# Altium footprint library Gate Driver Board.PcbLib: 117 footprints (part 4 of 8)
Each footprint in its own frame and in the unit in brackets; x right, y up, seen from the top. Pads: shape width x height; smd on the part's side, far side on the other; paste and mask are expansions set on the pad; w line width, h text height; cw(c..) or ccw(c..) is an arc to the next point about the centre after c.
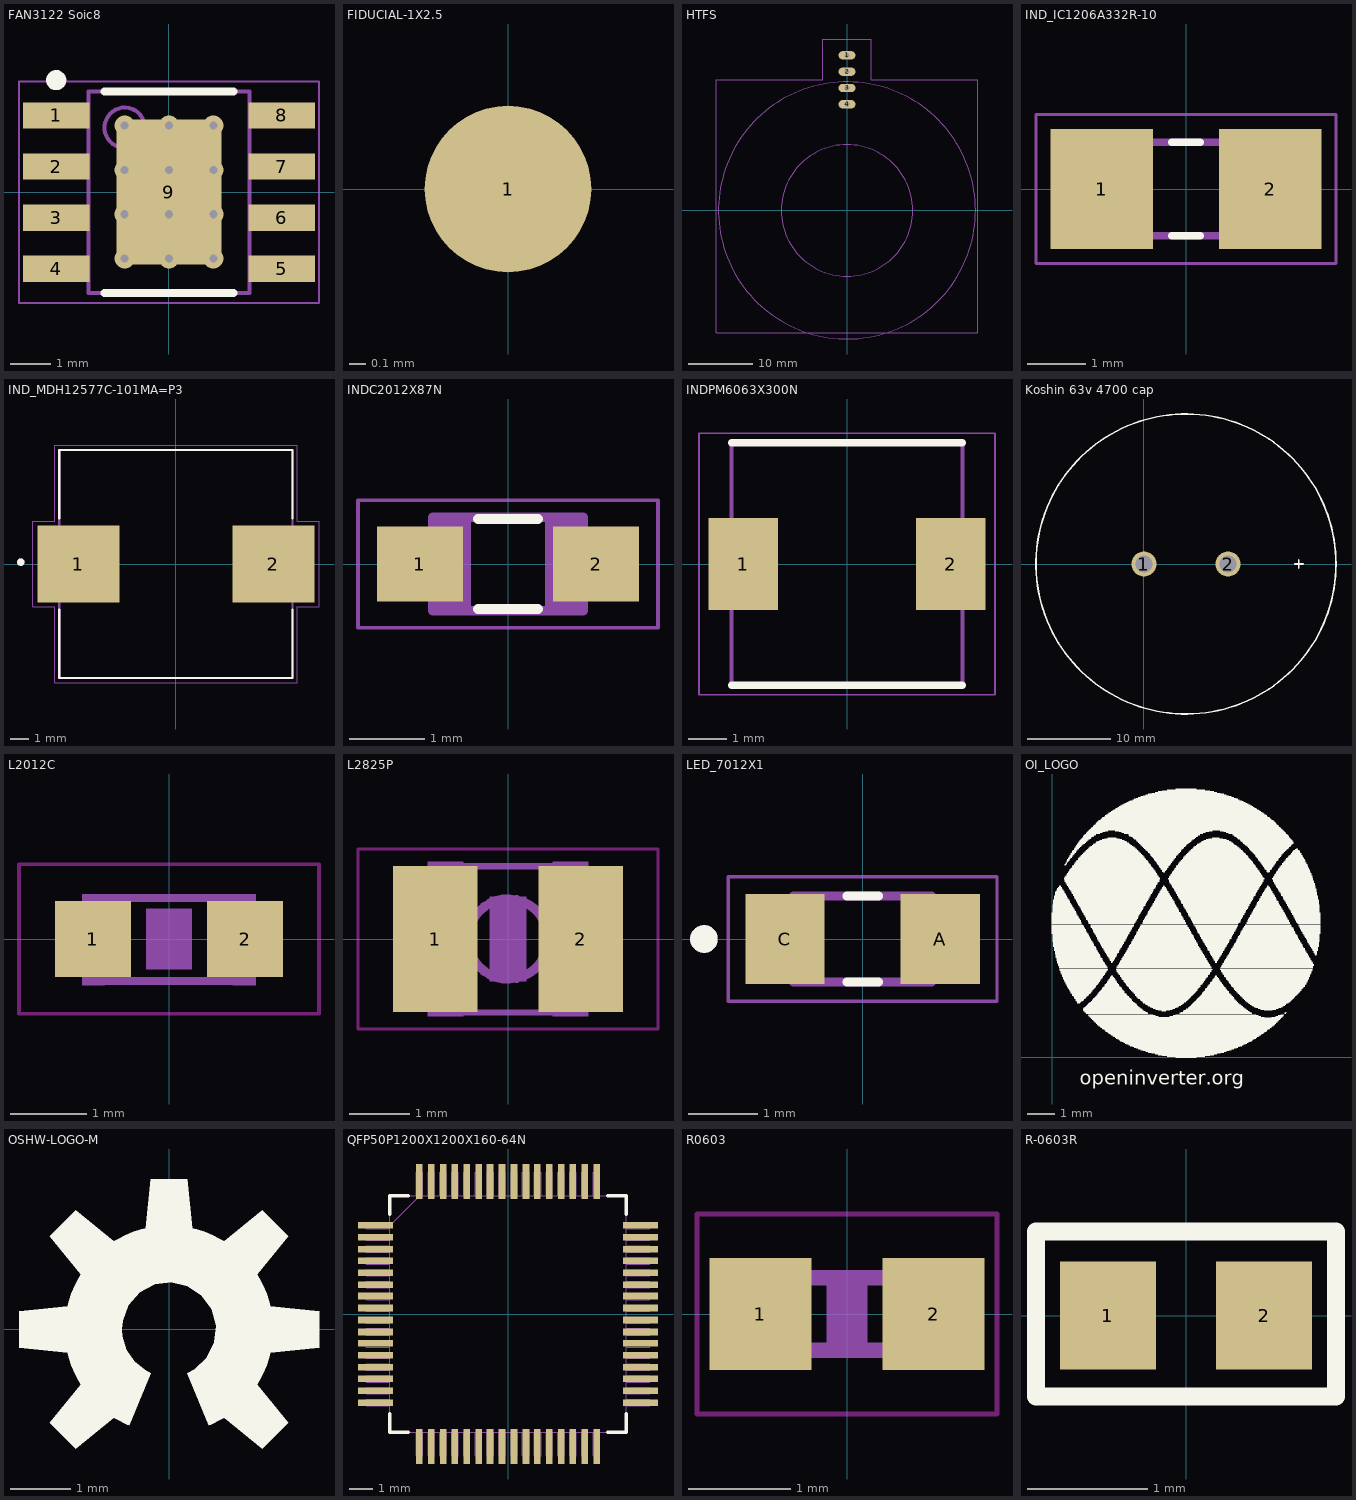
[diagram p3: the footprints below, top view; thin cyan lines are the x and y axes]

## FAN3122 Soic8 [mm] "SOIC, 8-Leads, Body 4.95x3.95mm, Pitch 1.27mm, Thermal Pad 4.10x3.10mm, IPC Medium Density"
height 1.75
pads (9):
  rect 1.65x0.65 smd: 1(-2.8,1.905) 2(-2.8,0.635) 3(-2.8,-0.635) 4(-2.8,-1.905) 5(2.8,-1.905) 6(2.8,-0.635) 7(2.8,0.635) 8(2.8,1.905)
  rect 2.6x3.6 smd: 9(0,0)
via -1.1,1.65 diameter 0.5 hole 0.2
via 0,1.65 diameter 0.5 hole 0.2
via 1.1,1.65 diameter 0.5 hole 0.2
via -1.1,0.55 diameter 0.5 hole 0.2
via 0,0.55 diameter 0.5 hole 0.2
via 1.1,0.55 diameter 0.5 hole 0.2
via -1.1,-0.55 diameter 0.5 hole 0.2
via 0,-0.55 diameter 0.5 hole 0.2
via 1.1,-0.55 diameter 0.5 hole 0.2
via -1.1,-1.65 diameter 0.5 hole 0.2
via 0,-1.65 diameter 0.5 hole 0.2
via 1.1,-1.65 diameter 0.5 hole 0.2
Top Overlay:
  circle w0.25: c-2.8,2.78 r0.125
  lines w0.2: -1.6,-2.5 1.6,-2.5 ; -1.6,2.5 1.6,2.5
Assembly Top:
  circle w0.1: c-1.1,1.6 r0.5
  lines w0.1: -2,-2.5 -2,2.5 2,2.5 2,-2.5 -2,-2.5
Courtyard Top:
  lines w0.05: -3.725,-2.75 -3.725,2.75 3.725,2.75 3.725,-2.75 -3.725,-2.75
  lines w0.1: -0.5,0 0.5,0 ; 0,-0.5 0,0.5
3D body "User Library-SOIC8_JEDEC_MS-012AA.STEP": height 1.66, standoff -0.09, extent -3.124,-2.55 3.075,2.45

## FIDUCIAL-1X2.5 [mm] "FIDUCIAL-1X2.5"
pads (1):
  rrect100% 1x1 smd paste+0: 1(0,0)
Top Solder:
  circle w1.27: c0,0 r0.9

## HTFS [mil] "HTFS"
pads (4):
  oval 103x51.5 / inner round 0 / far side oval 103x51.5 hole 31.5: 1(0,950) 2(0,850) 3(0,750) 4(0,650)
3D Body Bottom:
  circle w5: c0,0 r403.11
  circle w5: c0,0 r787.4
  lines w5: -800,-750 -800,800 -150,800 -150,1050 150,1050 150,800 800,800 800,-750 -800,-750
3D body: height 50, standoff 0, extent -51.72,624.03 51.72,675.97
3D body: height 50, standoff 0, extent -51.72,724.03 51.72,775.97
3D body: height 50, standoff 0, extent -51.72,824.03 51.72,875.97
3D body: height 50, standoff 0, extent -51.72,924.03 51.72,975.97

## IND_IC1206A332R-10 [mm]
pads (2):
  rect 1.76x2.06 smd: 1(-1.445,0) 2(1.445,0)
Top Overlay:
  lines w0.127: -0.245,-0.8 0.245,-0.8 ; -0.245,0.8 0.245,0.8
Mechanical 13:
  lines w0.127: -1.6,-0.8 -1.6,0.8 1.6,0.8 1.6,-0.8 -1.6,-0.8
Mechanical 15:
  lines w0.05: -2.575,-1.28 -2.575,1.28 2.575,1.28 2.575,-1.28 -2.575,-1.28
3D body "step_temp.STEP": height 1.4, standoff 0, extent -1.6,-0.8 1.6,0.8

## IND_MDH12577C-101MA=P3 [mm]
pads (2):
  rect 4.5x4.2 smd: 1(-5.35,0) 2(5.35,0)
Top Overlay:
  circle w0.2: c-8.505,0.1 r0.1
  lines w0.127: -6.4,-2.5 -6.4,-6.25 6.4,-6.25 6.4,-2.5 ; -6.4,2.5 -6.4,6.25 6.4,6.25 6.4,2.5
Mechanical 13:
  circle w0.2: c-8.505,0.1 r0.1
  lines w0.127: -6.4,-6.25 6.4,-6.25 6.4,6.25 -6.4,6.25 -6.4,-6.25
Mechanical 15:
  lines w0.05: -7.85,-2.35 -6.65,-2.35 -6.65,-6.5 6.65,-6.5 6.65,-2.35 7.85,-2.35 7.85,2.35 6.65,2.35 6.65,6.5 -6.65,6.5 -6.65,2.35 -7.85,2.35 -7.85,-2.35
3D body "MDH12577C-101MA=P3.STEP": height 8, standoff 0, extent -6.358,-6.278 6.442,6.222

## INDC2012X87N [mm]
pads (2):
  rect 1.15x1 smd: 1(-1.175,0) 2(1.175,0)
Top Overlay:
  lines w0.127: -0.4,-0.6 0.4,-0.6 ; -0.4,0.6 0.4,0.6
Mechanical 13:
  region: -0.5,-0.625 -1,-0.625 -1,0.625 -0.5,0.625
  region: 1,-0.625 0.5,-0.625 0.5,0.625 1,0.625
  lines w0.127: -1,-0.625 1,-0.625 1,0.625 -1,0.625 -1,-0.625
Mechanical 15:
  lines w0.051: -2,-0.85 2,-0.85 2,0.85 -2,0.85 -2,-0.85
3D body "MLZ2012M100HTD25.STEP": height 1.03, standoff -0.02, extent -1,-0.625 1,0.625

## INDPM6063X300N [mm]
pads (2):
  rect 1.8x2.4 smd: 1(-2.7,0) 2(2.7,0)
Top Overlay:
  lines w0.2: -3,-3.15 3,-3.15 ; -3,3.15 3,3.15
Mechanical 13:
  lines w0.1: -3,-3.15 -3,3.15 3,3.15 3,-3.15 -3,-3.15
Mechanical 15:
  lines w0.05: -3.85,-3.4 -3.85,3.4 3.85,3.4 3.85,-3.4 -3.85,-3.4
3D body "B82462G4333M000.stp": height 3, standoff 0, extent -3,-3.15 3,3.15

## Koshin 63v 4700 cap [mm]
pads (2):
  round 3 hole 2: 1(0,0) 2(10.1,0)
Top Overlay:
  circle w0.2: c5.05,0 r18
  lines w0.2: 18.082,0 19.098,0 ; 18.59,-0.508 18.59,0.508
3D body "Snap-Cap 35mm W x 50mm H 10mm pitch.step": height 50, standoff -6.2, extent -12.571,-17.421 22.425,17.575

## L2012C [mm] "L2012C"
pads (2):
  rect 1x1 smd: 1(-1,0) 2(1,0)
Top Layer keep-out:
  lines w0.051: -1.973,-0.983 1.973,-0.983 1.973,0.983 -1.973,0.983 -1.973,-0.983
Assembly Bottom:
  region: -1.143,-0.61 -1.143,0.59 -0.843,0.59 -0.843,-0.61
  region: 0.838,-0.61 0.838,0.59 1.138,0.59 1.138,-0.61
  lines w0.102: -0.864,-0.553 0.864,-0.553 ; -0.864,0.54 0.864,0.54
Top Glue Points:
  region: -0.3,-0.4 -0.3,0.4 0.3,0.4 0.3,-0.4

## L2825P [mm] "L2825P"
pads (2):
  rect 1.4x2.4 smd: 1(-1.2,0) 2(1.2,0)
Top Layer keep-out:
  lines w0.051: -2.473,-1.483 2.473,-1.483 2.473,1.483 -2.473,1.483 -2.473,-1.483
Assembly Bottom:
  circle w0.152: c0,0 r0.66
  region: 0.737,-1.27 0.737,1.27 1.321,1.27 1.321,-1.27
  region: -1.321,-1.27 -1.321,1.27 -0.737,1.27 -0.737,-1.27
  lines w0.102: -1.34,-0.965 -1.34,0.965 ; -0.762,-1.213 0.762,-1.213 ; -0.762,1.2 0.762,1.2 ; 1.34,-0.965 1.34,0.965
Top Glue Points:
  region: -0.3,-0.7 -0.3,0.7 0.3,0.7 0.3,-0.7

## LED_7012X1 [mm]
pads (2):
  rect 1.15x1.3 smd: A(1.125,0) C(-1.125,0)
Top Overlay:
  circle w0.2: c-2.3,0 r0.1
  lines w0.127: -0.23,-0.625 0.23,-0.625 ; -0.23,0.625 0.23,0.625
Mechanical 13:
  circle w0.2: c-2.3,0 r0.1
  lines w0.127: -1,-0.625 -1,0.625 1,0.625 1,-0.625 -1,-0.625
Mechanical 15:
  lines w0.05: -1.95,-0.9 -1.95,0.9 1.95,0.9 1.95,-0.9 -1.95,-0.9
3D body "7012X1--3DModel-STEP-1.STEP": height 0.73, standoff 0, extent -1.003,-0.622 1.003,0.622

## OI_LOGO [mm] "OI_LOGO"
Top Overlay:
  drawing of 1208 lines, arcs and shapes, not listed
  text "openinverter.org" at 1,-1 h0.52

## OSHW-LOGO-M [mm] "OSHW-LOGO-M"
Top Overlay:
  region: 0.658,-1.588 0.691,-1.574 0.755,-1.544 0.819,-1.512 0.881,-1.477 0.911,-1.458 1.539,-1.97 1.97,-1.539 1.458,-0.911 1.495,-0.85 1.561,-0.724 1.615,-0.592 1.659,-0.456 1.675,-0.387 2.481,-0.305 2.481,0.305 1.675,0.387 1.659,0.456 1.615,0.592 1.561,0.724 1.495,0.85 1.458,0.911 1.97,1.539 1.539,1.97 0.911,1.458 0.85,1.495 0.724,1.561 0.592,1.615 0.456,1.659 0.387,1.675 0.305,2.481 -0.305,2.481 -0.387,1.675 -0.456,1.659 -0.592,1.615 -0.724,1.561 -0.85,1.495 -0.911,1.458 -1.539,1.97 -1.97,1.539 -1.458,0.911 -1.495,0.85 -1.561,0.724 -1.615,0.592 -1.659,0.456 -1.675,0.387 -2.481,0.305 -2.481,-0.305 -1.675,-0.387 -1.659,-0.456 -1.615,-0.592 -1.561,-0.724 -1.495,-0.85 -1.458,-0.911 -1.97,-1.539 -1.539,-1.97 -0.911,-1.458 -0.881,-1.477 -0.819,-1.512 -0.755,-1.544 -0.691,-1.574 -0.658,-1.588 -0.299,-0.722 -0.402,-0.67 -0.579,-0.525 -0.706,-0.334 -0.773,-0.115 -0.781,0 -0.769,0.14 -0.67,0.402 -0.486,0.612 -0.239,0.744 0.038,0.78 0.311,0.717 0.543,0.561 0.706,0.334 0.779,0.064 0.751,-0.215 0.628,-0.465 0.423,-0.657 0.299,-0.722

## QFP50P1200X1200X160-64N [mil]
pads (64):
  rect 58x11 smd: 1(-221,148) 2(-221,128) 3(-221,108) 4(-221,89) 5(-221,69) 6(-221,49) 7(-221,30) 8(-221,10) 9(-221,-10) 10(-221,-30) 11(-221,-49) 12(-221,-69) 13(-221,-89) 14(-221,-108) 15(-221,-128) 16(-221,-148) 33(221,-148) 34(221,-128) 35(221,-108) 36(221,-89) 37(221,-69) 38(221,-49) 39(221,-30) 40(221,-10) 41(221,10) 42(221,30) 43(221,49) 44(221,69) 45(221,89) 46(221,108) 47(221,128) 48(221,148)
  rect 11x58 smd: 17(-148,-221) 18(-128,-221) 19(-108,-221) 20(-89,-221) 21(-69,-221) 22(-49,-221) 23(-30,-221) 24(-10,-221) 25(10,-221) 26(30,-221) 27(49,-221) 28(69,-221) 29(89,-221) 30(108,-221) 31(128,-221) 32(148,-221) 49(148,221) 50(128,221) 51(108,221) 52(89,221) 53(69,221) 54(49,221) 55(30,221) 56(10,221) 57(-10,221) 58(-30,221) 59(-49,221) 60(-69,221) 61(-89,221) 62(-108,221) 63(-128,221) 64(-148,221)
Top Overlay:
  lines w6: -197,-166 -197,-197 -166,-197 ; -197,166 -197,197 -166,197 ; 166,-197 197,-197 197,-166 ; 166,197 197,197 197,166
Mechanical 13:
  drawing of 331 lines, arcs and shapes, not listed
3D body "STM32F103RBT6--3DModel-STEP-56544.STEP": height 63.54, standoff 0.55, extent -236.21,-236.22 236.23,236.22

## R0603 [mm] "R0603"
pads (2):
  rect 1x1.1 smd: 1(-0.85,0) 2(0.85,0)
Top Layer keep-out:
  lines w0.051: -1.473,-0.983 -1.473,0.983 1.473,0.983 1.473,-0.983 -1.473,-0.983
Assembly Bottom:
  region: -0.838,-0.432 -0.838,0.432 -0.432,0.432 -0.432,-0.432
  region: 0.432,-0.432 0.432,0.432 0.838,0.432 0.838,-0.432
  lines w0.152: -0.432,-0.356 0.432,-0.356 ; -0.432,0.356 0.432,0.356
Top Glue Points:
  region: -0.2,-0.4 -0.2,0.4 0.2,0.4 0.2,-0.4

## R-0603R [mm] "resistor 0603 reflow soldering"
pads (2):
  rect 0.8x0.9 smd: 1(-0.65,0) 2(0.65,0)
Top Overlay:
  lines w0.152: -1.25,-0.675 0.325,-0.675 1.25,-0.675 1.25,0.7 0.35,0.7 -1.25,0.7 -1.25,-0.675
3D body "res0603.stp": height 0.45, standoff 0, extent -0.8,-0.4 0.8,0.4